# Altium footprint library myPCBLib.PcbLib: 113 footprints (part 5 of 8)
Each footprint in its own frame and in the unit in brackets; x right, y up, seen from the top. Pads: shape width x height; smd on the part's side, far side on the other; paste and mask are expansions set on the pad; w line width, h text height; cw(c..) or ccw(c..) is an arc to the next point about the centre after c.
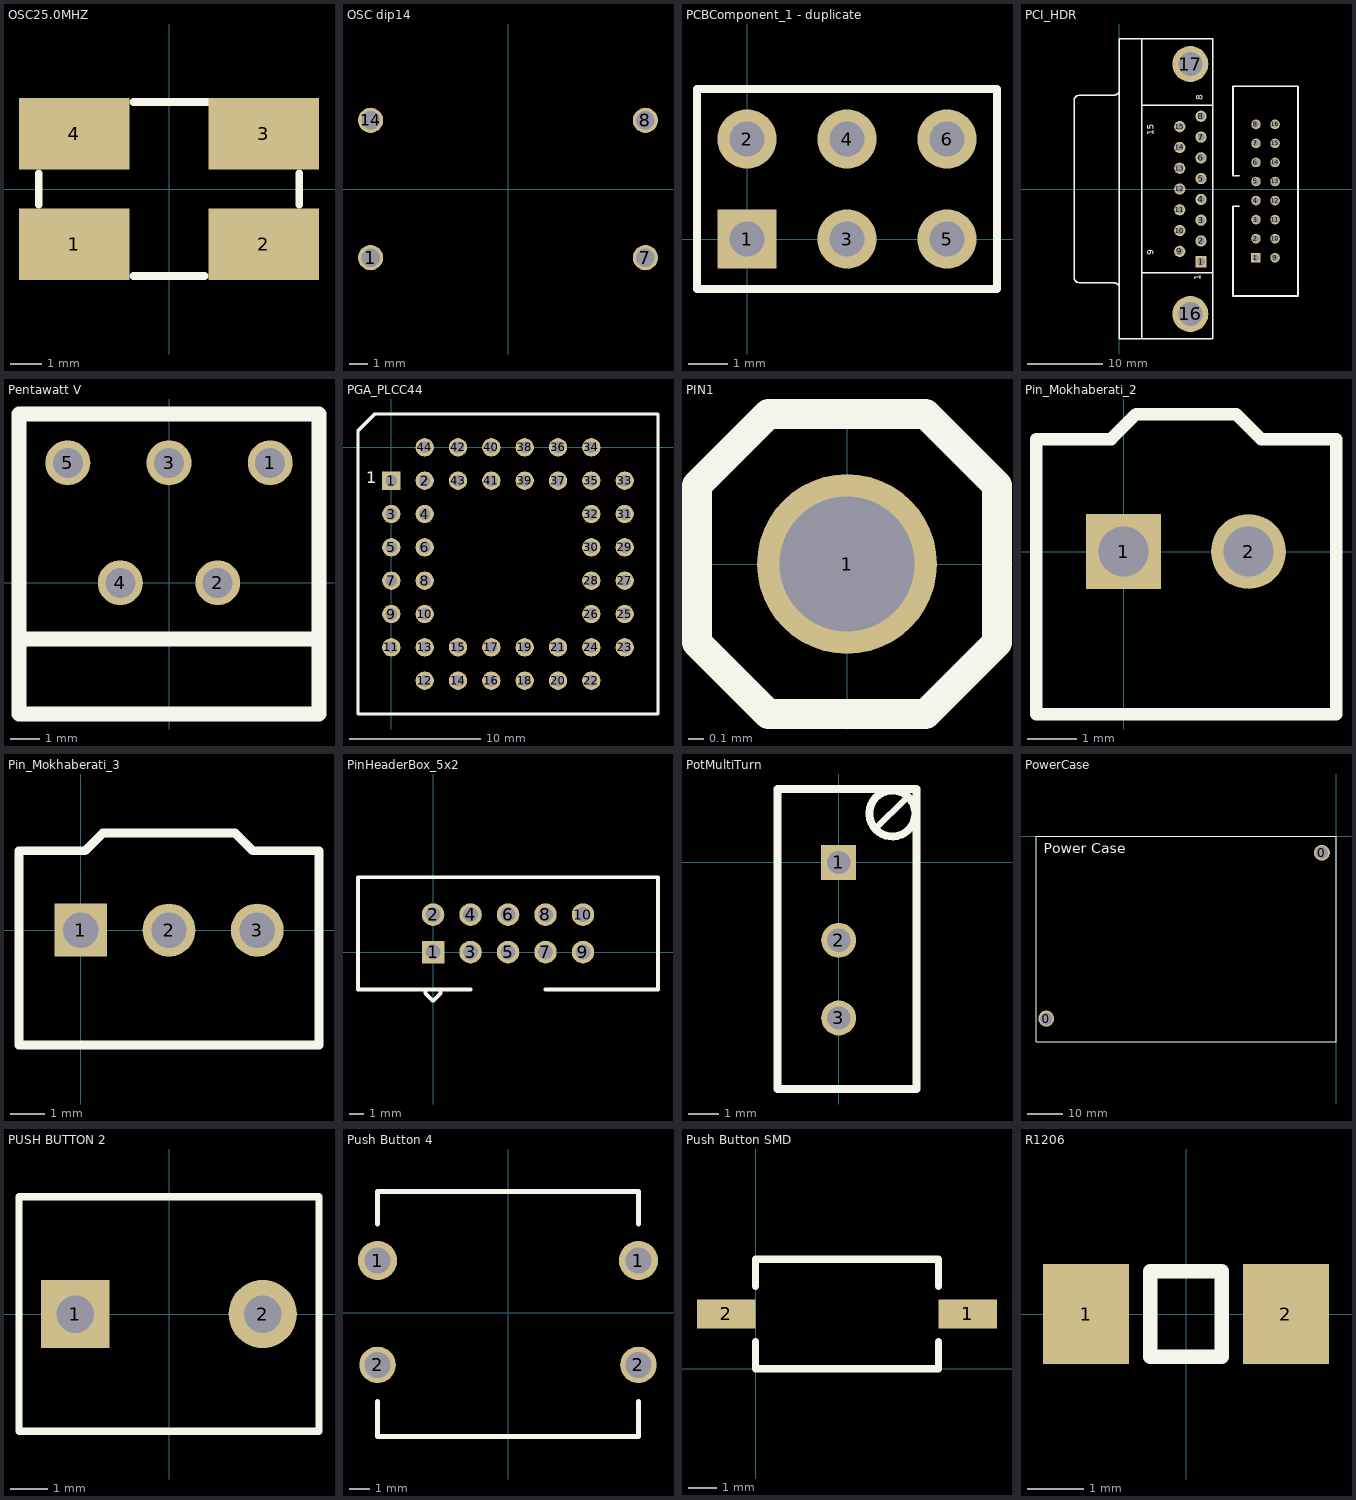
[diagram p4: the footprints below, top view; thin cyan lines are the x and y axes]

## OSC25.0MHZ [mil]
pads (4):
  rect 140x90 smd: 1(-120,-70) 2(120,-70) 3(120,70) 4(-120,70)
Top Overlay:
  lines w10: -165,-20 -165,20 ; -45,-110 45,-110 ; -45,110 50,110 ; 165,-20 165,20
3D body: height 51.57, standoff 0, extent -137.8,-100 137.8,96.85

## OSC dip14 [mil]
pads (4):
  round 55 hole 40: 1(-300,-150) 7(300,-150) 8(300,150) 14(-300,150)
3D body: height 181.1, standoff -78.74, extent -397.63,-249.99 397.64,250.01

## PCBComponent_1 - duplicate [mm]
pads (6):
  rect 1.5x1.5 hole 0.9: 1(0,0)
  round 1.5 hole 0.9: 2(0,2.54) 3(2.54,0) 4(2.54,2.54) 5(5.08,0) 6(5.08,2.54)
Top Overlay:
  lines w0.2: -1.27,-1.27 6.35,-1.27 6.35,3.81 -1.27,3.81 -1.27,-1.27

## PCI_HDR [mm]
pads (33):
  rect 1.5x1.5 hole 1: 1(10.92,-9.687)
  rect 1.27x1.27 hole 0.889: 1(18.25,-9.152)
  round 1.5 hole 1: 2(10.92,-6.917) 3(10.92,-4.147) 4(10.92,-1.377) 5(10.92,1.393) 6(10.92,4.163) 7(10.92,6.933) 8(10.92,9.703) 9(8.08,-8.302) 10(8.08,-5.532) 11(8.08,-2.762) 12(8.08,0.008) 13(8.08,2.778) 14(8.08,5.548) 15(8.08,8.318)
  round 1.27 hole 0.889: 2(18.25,-6.612) 3(18.25,-4.072) 4(18.25,-1.532) 5(18.25,1.008) 6(18.25,3.548) 7(18.25,6.088) 8(18.25,8.628) 9(20.79,-9.152) 10(20.79,-6.612) 11(20.79,-4.072) 12(20.79,-1.532) 13(20.79,1.008) 14(20.79,3.548) 15(20.79,6.088) 16(20.79,8.628)
  round 4.8 hole 3.18: 16(9.5,-16.652) 17(9.5,16.668)
Top Overlay:
  lines w0.2: -5.305,-12.487 cw(c-5.305,-11.792) -6,-11.792 -6,11.808 cw(c-5.305,11.808) -5.305,12.503 ; -5.3,-12.492 -0.7,-12.492 cw(c-0.7,-13.187) -0.005,-13.187 ; -5.3,12.508 -0.7,12.508 ccw(c-0.7,13.203) -0.005,13.203 ; 3,-19.992 3,20.008 ; 3,-11.132 12.5,-11.132 ; 3,11.148 12.5,11.148 ; 0,-19.992 0,20.008 12.5,20.008 12.5,-19.992 0,-19.992
  lines w0.254: 15.964,-2.294 15.202,-2.294 15.202,-14.232 23.838,-14.232 23.838,13.708 15.202,13.708 15.202,1.77 15.964,1.77
  text "8" at 11.5,11.848 h1.5
  text "9" at 4.975,-8.802 h1.5
  text "15" at 4.975,7.193 h1.5
  text "1" at 11.25,-12.152 h1.5
3D body: height 8.8, standoff -3, extent 15.102,-14.172 24.502,13.648

## Pentawatt V [mil]
height 800
pads (5):
  round 60 hole 40: 1(135,160) 2(65,0) 3(0,160) 4(-65,0) 5(-135,160)
Top Overlay:
  lines w20: -200,-75 200,-75 ; -200,-175 -200,225 200,225 200,-175 -200,-175

## PGA_PLCC44 [mil]
pads (44):
  rect 55x55 hole 35: 1(0,-100)
  round 55 hole 35: 2(100,-100) 3(0,-200) 4(100,-200) 5(0,-300) 6(100,-300) 7(0,-400) 8(100,-400) 9(0,-500) 10(100,-500) 11(0,-600) 12(100,-700) 13(100,-600) 14(200,-700) 15(200,-600) 16(300,-700) 17(300,-600) 18(400,-700) 19(400,-600) 20(500,-700) 21(500,-600) 22(600,-700) 23(700,-600) 24(600,-600) 25(700,-500) 26(600,-500) 27(700,-400) 28(600,-400) 29(700,-300) 30(600,-300) 31(700,-200) 32(600,-200) 33(700,-100) 34(600,0) 35(600,-100) 36(500,0) 37(500,-100) 38(400,0) 39(400,-100) 40(300,0) 41(300,-100) 42(200,0) 43(200,-100) 44(100,0)
Top Overlay:
  lines w10: -100,-800 -100,50 -50,100 800,100 800,-800 -100,-800
  text "." at -170,5 h100
  text "1" at -75,-120 h60

## PIN1 [mm]
pads (1):
  round 1.2 hole 0.9: 1(0,0)
Top Overlay:
  lines w0.2: -1,-0.524 -1,0.524 -0.524,1 0.524,1 1,0.524 1,-0.524 0.524,-1 -0.524,-1 -1,-0.524
  text "." at 1.016,1.016 h0.89

## Pin_Mokhaberati_2 [mil]
pads (2):
  rect 60x60 hole 40: 1(0,0)
  round 60 hole 40: 2(100,0)
Top Overlay:
  lines w10: -70,-130 170,-130 170,90 110,90 90,110 10,110 -10,90 -70,90 -70,-130

## Pin_Mokhaberati_3 [mil]
pads (3):
  rect 60x60 hole 40: 1(0,0)
  round 60 hole 40: 2(100,0) 3(200,0)
Top Overlay:
  lines w10: -70,-130 250,-130 270,-130 270,90 195,90 175,110 25,110 5,90 -70,90 -70,-130

## PinHeaderBox_5x2 [mil]
pads (10):
  rect 60x60 hole 40: 1(0,0)
  round 60 hole 40: 2(0,100) 3(100,0) 4(100,100) 5(200,0) 6(200,100) 7(300,0) 8(300,100) 9(400,0) 10(400,100)
Top Overlay:
  lines w10: -20,-100 -20,-110 0,-130 20,-110 20,-100 ; 100,-100 -200,-100 -200,200 600,200 600,-100 300,-100

## PotMultiTurn [mil]
pads (3):
  rect 45x45 hole 30: 1(0,0)
  round 45 hole 30: 2(0,-100) 3(0,-200)
Top Overlay:
  circle w10: c68.93,62.99 r29.56
  lines w8: 47.24,43.31 86.61,82.68
  lines w10: -78.74,-291.34 -78.74,94.49 100,94.49 100,-291.34 -78.74,-291.34

## PowerCase [mm]
pads (2):
  round 4.5 hole 3.5: 0(-82.1,-51.7) 0(-4,-4.7)
Top Overlay:
  lines w0.203: -85,-58.3 0,-58.3 0,0 -85,0 -85,-58.3
  text "Power Case" at -82.8,-5.8 h5

## PUSH BUTTON 2 [mm]
pads (2):
  rect 1.85x1.85 hole 1.016: 1(-2.54,0)
  round 1.85 hole 1.016: 2(2.54,0)
Top Overlay:
  lines w0.2: -4.064,-3.175 -4.064,3.175 4.064,3.175 4.064,-3.175 -4.064,-3.175

## Push Button 4 [mil]
pads (4):
  round 75 hole 50: 1(-250,100) 1(250,100)
  round 70 hole 50: 2(-250,-100) 2(250,-100)
Top Overlay:
  lines w10: -250,-170 -250,-237.5 250,-237.5 250,-170 ; -250,170 -250,232.5 77.5,232.5 182.5,232.5 250,232.5 250,170

## Push Button SMD [mil]
pads (2):
  rect 80x40 smd: 1(290,75) 2(-40,75)
Top Overlay:
  lines w10: 0,37.5 0,0 250,0 250,37.5 ; 0,112.5 0,150 250,150 250,112.5

## R1206 [mil]
pads (2):
  rect 60x70 smd: 1(-70,0) 2(70,0)
Top Overlay:
  lines w10: -25,-30 -25,30 25,30 25,-30 -25,-30